# Altium footprint library hdmi_lvds.PcbLib: 60 footprints (part 4 of 4)
Each footprint in its own frame and in the unit in brackets; x right, y up, seen from the top. Pads: shape width x height; smd on the part's side, far side on the other; paste and mask are expansions set on the pad; w line width, h text height; cw(c..) or ccw(c..) is an arc to the next point about the centre after c.
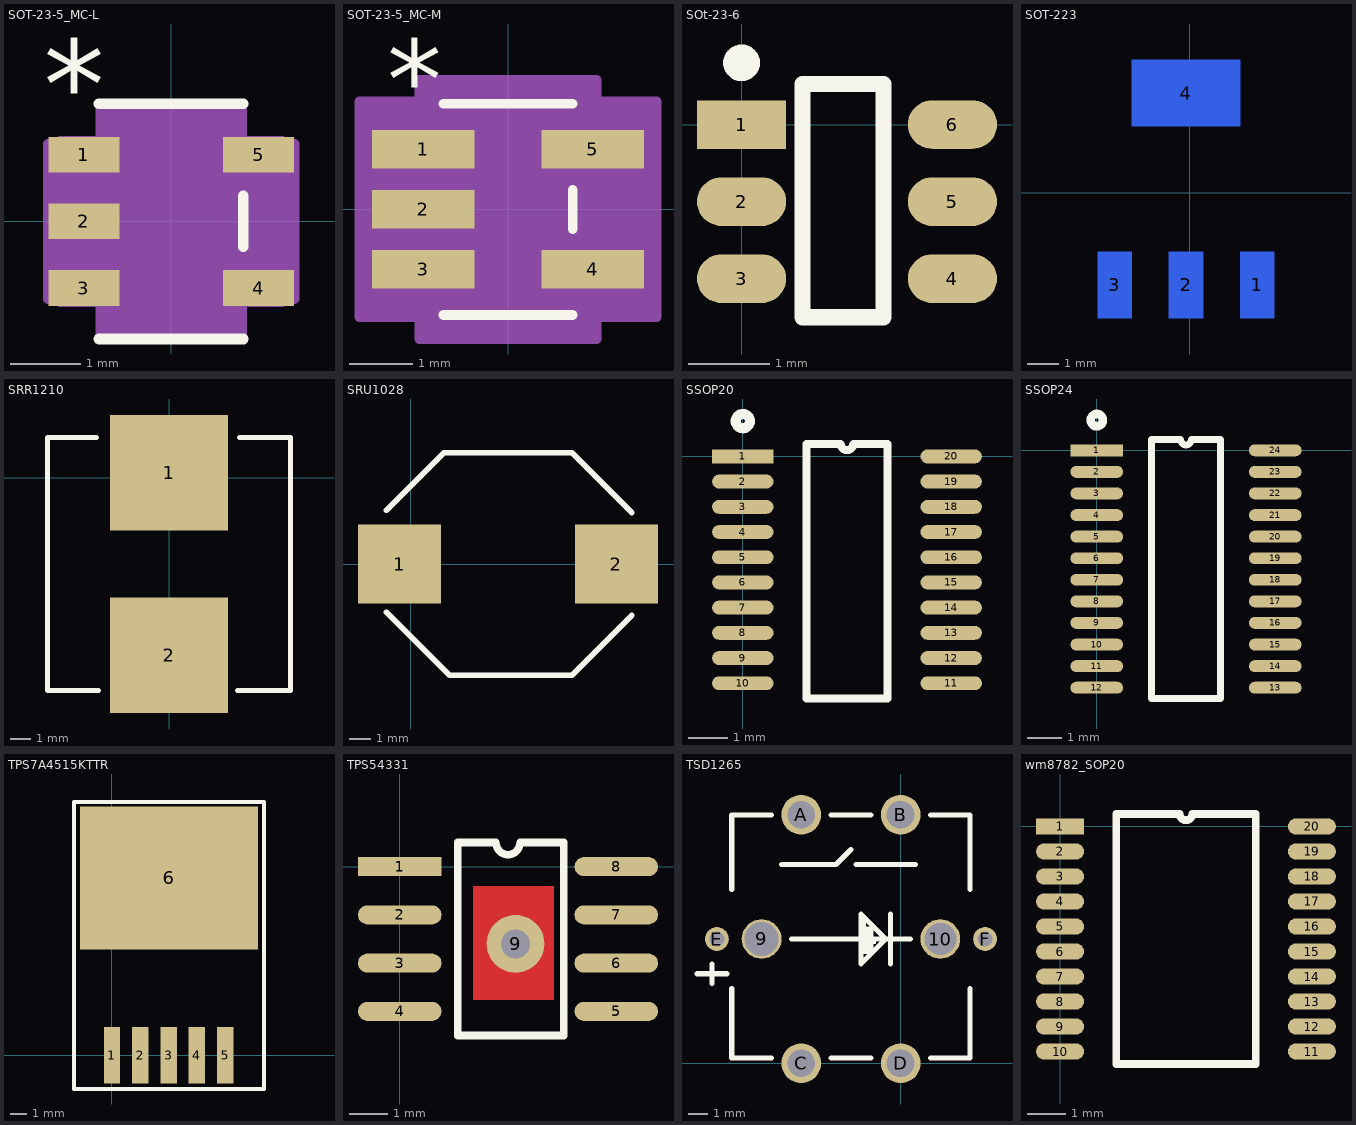
[diagram p3: the footprints below, top view; thin cyan lines are the x and y axes]

## SOT-23-5_MC-L [mil]
pads (5):
  rect 40x20 smd paste+0 mask+0: 1(-49,37.4) 2(-49,0) 3(-49,-37.4) 4(49,-37.4) 5(49,37.4)
Top Overlay:
  lines w6: -40.5,-66 40.5,-66 ; -40.5,66 40.5,66 ; 40.5,-14.3 40.5,14.3
  text "*" at -71.5,52.4 h50
Mechanical 13:
  lines w0: -12,61 ccw(c0,61) 12,61
  lines w1: -63,-47.4 -35.5,-47.4 -35.5,-27.4 -63,-27.4 -63,-47.4 ; -63,-10 -35.5,-10 -35.5,10 -63,10 -63,-10 ; -63,27.4 -35.5,27.4 -35.5,47.4 -63,47.4 -63,27.4 ; -35.5,-61 -35.5,61 35.5,61 35.5,-61 -35.5,-61 ; 35.5,-47.4 63,-47.4 63,-27.4 35.5,-27.4 35.5,-47.4 ; 35.5,27.4 63,27.4 63,47.4 35.5,47.4 35.5,27.4
  text "*" at -38,14.4 h50
Mechanical 15:
  region: 39.5,-65 -39.5,-65 -39.5,-43.4 -69,-43.4 -69,43.4 -39.5,43.4 -39.5,65 39.5,65 39.5,43.4 69,43.4 69,-43.4 39.5,-43.4
  lines w6: -69,-43.4 -69,43.4 -39.5,43.4 -39.5,65 39.5,65 39.5,43.4 69,43.4 69,-43.4 39.5,-43.4 39.5,-65 -39.5,-65 -39.5,-43.4 -69,-43.4
3D body: height 10, standoff 0, extent 0,0 10,10

## SOT-23-5_MC-M [mil]
pads (5):
  rect 64x24 smd paste+0 mask+0: 1(-53,37.4) 2(-53,0) 3(-53,-37.4) 4(53,-37.4) 5(53,37.4)
Top Overlay:
  lines w6: -40.5,-66 40.5,-66 ; -40.5,66 40.5,66 ; 40.5,-12.3 40.5,12.3
  text "*" at -75.5,56.4 h50
Mechanical 13:
  lines w0: -12,61 ccw(c0,61) 12,61
  lines w1: -63,-47.4 -63,-27.4 -35.5,-27.4 -35.5,-47.4 -63,-47.4 ; -63,-10 -63,10 -35.5,10 -35.5,-10 -63,-10 ; -63,27.4 -63,47.4 -35.5,47.4 -35.5,27.4 -63,27.4 ; -35.5,-61 35.5,-61 35.5,61 -35.5,61 -35.5,-61 ; 35.5,-47.4 35.5,-27.4 63,-27.4 63,-47.4 35.5,-47.4 ; 35.5,27.4 35.5,47.4 63,47.4 63,27.4 35.5,27.4
  text "*" at -38,18.4 h50
Mechanical 15:
  region: 55.5,-81 -55.5,-81 -55.5,-67.4 -93,-67.4 -93,67.4 -55.5,67.4 -55.5,81 55.5,81 55.5,67.4 93,67.4 93,-67.4 55.5,-67.4
  lines w6: -93,-67.4 -55.5,-67.4 -55.5,-81 55.5,-81 55.5,-67.4 93,-67.4 93,67.4 55.5,67.4 55.5,81 -55.5,81 -55.5,67.4 -93,67.4 -93,-67.4
3D body: height 10, standoff 0, extent 0,0 10,10

## SOt-23-6 [mm]
pads (6):
  rect 1.1x0.6 smd: 1(0,0)
  oval 1.1x0.6 smd: 2(0,-0.95) 3(0,-1.9) 4(2.6,-1.9) 5(2.6,-0.95) 6(2.6,0)
Top Overlay:
  circle w0.254: c0,0.762 r0.1
  lines w0.2: 0.75,-2.375 0.75,0.5 1.75,0.5 1.75,-2.375 0.75,-2.375

## SOT-223 [mm]
height 0.71
pads (4):
  rect 1.1x2.15 smd far side: 1(2.173,-2.973) 2(-0.127,-2.973) 3(-2.427,-2.973)
  rect 3.5x2.15 smd far side: 4(-0.127,3.227)
Bottom Overlay:
  circle w0.25: c2.173,-4.598 r0.125
  lines w0.2: -3.477,-1.498 3.223,-1.498 3.223,1.752 -3.477,1.752 -3.477,-1.498
3D body "SOT223.STEP": height 1.68, standoff 0, extent -3.378,-3.277 3.122,3.683

## SRR1210 [mm] "SRR1210 inductor 100uH"
height 10
pads (2):
  rect 5.9x5.8 smd: 1(0,0.254) 2(0,-8.89)
Top Overlay:
  lines w0.254: -3.632,2.032 -6.096,2.032 -6.096,-10.668 -3.532,-10.668 ; 3.432,-10.668 6.096,-10.668 6.096,2.032 3.532,2.032

## SRU1028 [mm] "SRU1028 inductor 4.7uH"
height 10
pads (2):
  rect 3.8x3.6 smd: 1(-0.5,0) 2(9.4,0)
Top Overlay:
  lines w0.254: -1.1,-2.202 1.778,-5.08 7.366,-5.08 10.1,-2.346 ; -1.1,2.456 1.524,5.08 7.366,5.08 10.1,2.346

## SSOP20 [mm] "SSOP20"
height 1.7
pads (20):
  rect 1.55x0.35 smd: 1(0,0)
  oval 1.55x0.35 smd: 2(0,-0.635) 3(0,-1.27) 4(0,-1.905) 5(0,-2.54) 6(0,-3.175) 7(0,-3.81) 8(0,-4.445) 9(0,-5.08) 10(0,-5.715) 11(5.25,-5.715) 12(5.25,-5.08) 13(5.25,-4.445) 14(5.25,-3.81) 15(5.25,-3.175) 16(5.25,-2.54) 17(5.25,-1.905) 18(5.25,-1.27) 19(5.25,-0.635) 20(5.25,0)
Top Overlay:
  circle w0.254: c0,0.889 r0.18
  lines w0.2: 1.61,-6.096 1.61,0.318 2.466,0.318 ccw(c2.625,0.318) 2.784,0.317 3.64,0.318 3.64,-6.096 1.61,-6.096

## SSOP24 [mm] "SSOP24"
height 1.7
pads (24):
  rect 1.55x0.35 smd: 1(0,0)
  oval 1.55x0.35 smd: 2(0,-0.635) 3(0,-1.27) 4(0,-1.905) 5(0,-2.54) 6(0,-3.175) 7(0,-3.81) 8(0,-4.445) 9(0,-5.08) 10(0,-5.715) 11(0,-6.35) 12(0,-6.985) 13(5.25,-6.985) 14(5.25,-6.35) 15(5.25,-5.715) 16(5.25,-5.08) 17(5.25,-4.445) 18(5.25,-3.81) 19(5.25,-3.175) 20(5.25,-2.54) 21(5.25,-1.905) 22(5.25,-1.27) 23(5.25,-0.635) 24(5.25,0)
Top Overlay:
  circle w0.254: c0,0.889 r0.18
  lines w0.2: 1.61,-7.302 3.64,-7.302 3.64,0.318 2.784,0.318 cw(c2.625,0.318) 2.466,0.318 1.61,0.318 1.61,-7.302

## TPS7A4515KTTR [mil] "TPS7A4515KTTR"
height 2
pads (6):
  rect 39x134 smd: 1(0,0) 2(67,0) 3(134,0) 4(201,0) 5(268,0)
  rect 421x338.6 smd: 6(135,420)
Top Overlay:
  lines w10: -90,-80 360,-80 360,600 -90,600 -90,-80

## TPS54331 [mm] "TPS54331 footprint"
height 1
pads (9):
  rect 2.2x0.5 smd: 1(0,0)
  oval 2.2x0.5 smd: 2(0,-1.27) 3(0,-2.54) 4(0,-3.81) 5(5.7,-3.81) 6(5.7,-2.54) 7(5.7,-1.27) 8(5.7,0)
  round 1.524 hole 0.762: 9(3.048,-2.032)
Top Layer:
  rectangle: 1.934,-3.508 4.064,-0.508
Bottom Layer:
  rectangle: 1.934,-3.508 4.064,-0.508
Top Overlay:
  lines w0.2: 1.524,-4.445 1.524,0.635 2.532,0.635 ccw(c2.85,0.635) 3.167,0.635 4.318,0.635 4.318,-4.445 1.524,-4.445

## TSD1265 [mm]
height 6.5
pads (8):
  round 2 hole 1.7: 9(-7,6.25)
  round 2 hole 1.6: 10(2,6.25)
  round 2 hole 1.4: A(-5,12.5) B(0,12.5) C(-5,0) D(0,0)
  round 1.2 hole 0.75: E(-9.25,6.25) F(4.25,6.25)
Top Overlay:
  rectangle: -2,6.25 -1.375,6.875
  rectangle: -2,7 -1.75,7.25
  rectangle: -2,6.75 -1.75,7
  rectangle: -2,6 -1.75,6.25
  rectangle: -1.75,5.625 -1.375,6
  rectangle: -2,5.625 -1.75,6
  rectangle: -2,5.5 -1.5,5.625
  rectangle: -1.75,6 -1.375,6.25
  rectangle: -1.5,5.5 -1.375,6.25
  rectangle: -1.375,6 -1.25,6.25
  lines w0.254: -10.25,4.5 -8.75,4.5 ; -9.5,4 -9.5,5 ; -8.5,3.75 -8.5,0.25 -6.5,0.25 ; -8.5,8.75 -8.5,12.5 -6.5,12.5 ; -6,10 -3.25,10 -2.5,10.75 ; -5.5,6.25 0.5,6.25 ; -3.5,0.25 -1.5,0.25 ; -3.5,12.5 -1.5,12.5 ; -2.25,10 0.75,10 ; -0.5,5 -0.5,7.5 ; -0.5,6.25 -0.75,6.25 ; 1.5,0.25 3.5,0.25 3.5,3.75 ; 1.5,12.5 3.5,12.5 3.5,8.75 ; -0.75,6.25 -2,7.5 -2,5 -0.75,6.25

## wm8782_SOP20 [mm]
pads (20):
  rect 1.25x0.42 smd: 1(0,0)
  oval 1.25x0.42 smd: 2(0,-0.65) 3(0,-1.3) 4(0,-1.95) 5(0,-2.6) 6(0,-3.25) 7(0,-3.9) 8(0,-4.55) 9(0,-5.2) 10(0,-5.85) 11(6.55,-5.85) 12(6.55,-5.2) 13(6.55,-4.55) 14(6.55,-3.9) 15(6.55,-3.25) 16(6.55,-2.6) 17(6.55,-1.95) 18(6.55,-1.3) 19(6.55,-0.65) 20(6.55,0)
Top Overlay:
  lines w0.2: 1.46,-6.175 1.46,0.325 3.113,0.325 ccw(c3.275,0.325) 3.437,0.325 5.09,0.325 5.09,-6.175 1.46,-6.175